# Altium footprint library OneBoxLib_OTHER.PcbLib: 64 footprints (part 1 of 4)
Each footprint in its own frame and in the unit in brackets; x right, y up, seen from the top. Pads: shape width x height; smd on the part's side, far side on the other; paste and mask are expansions set on the pad; w line width, h text height; cw(c..) or ccw(c..) is an arc to the next point about the centre after c.
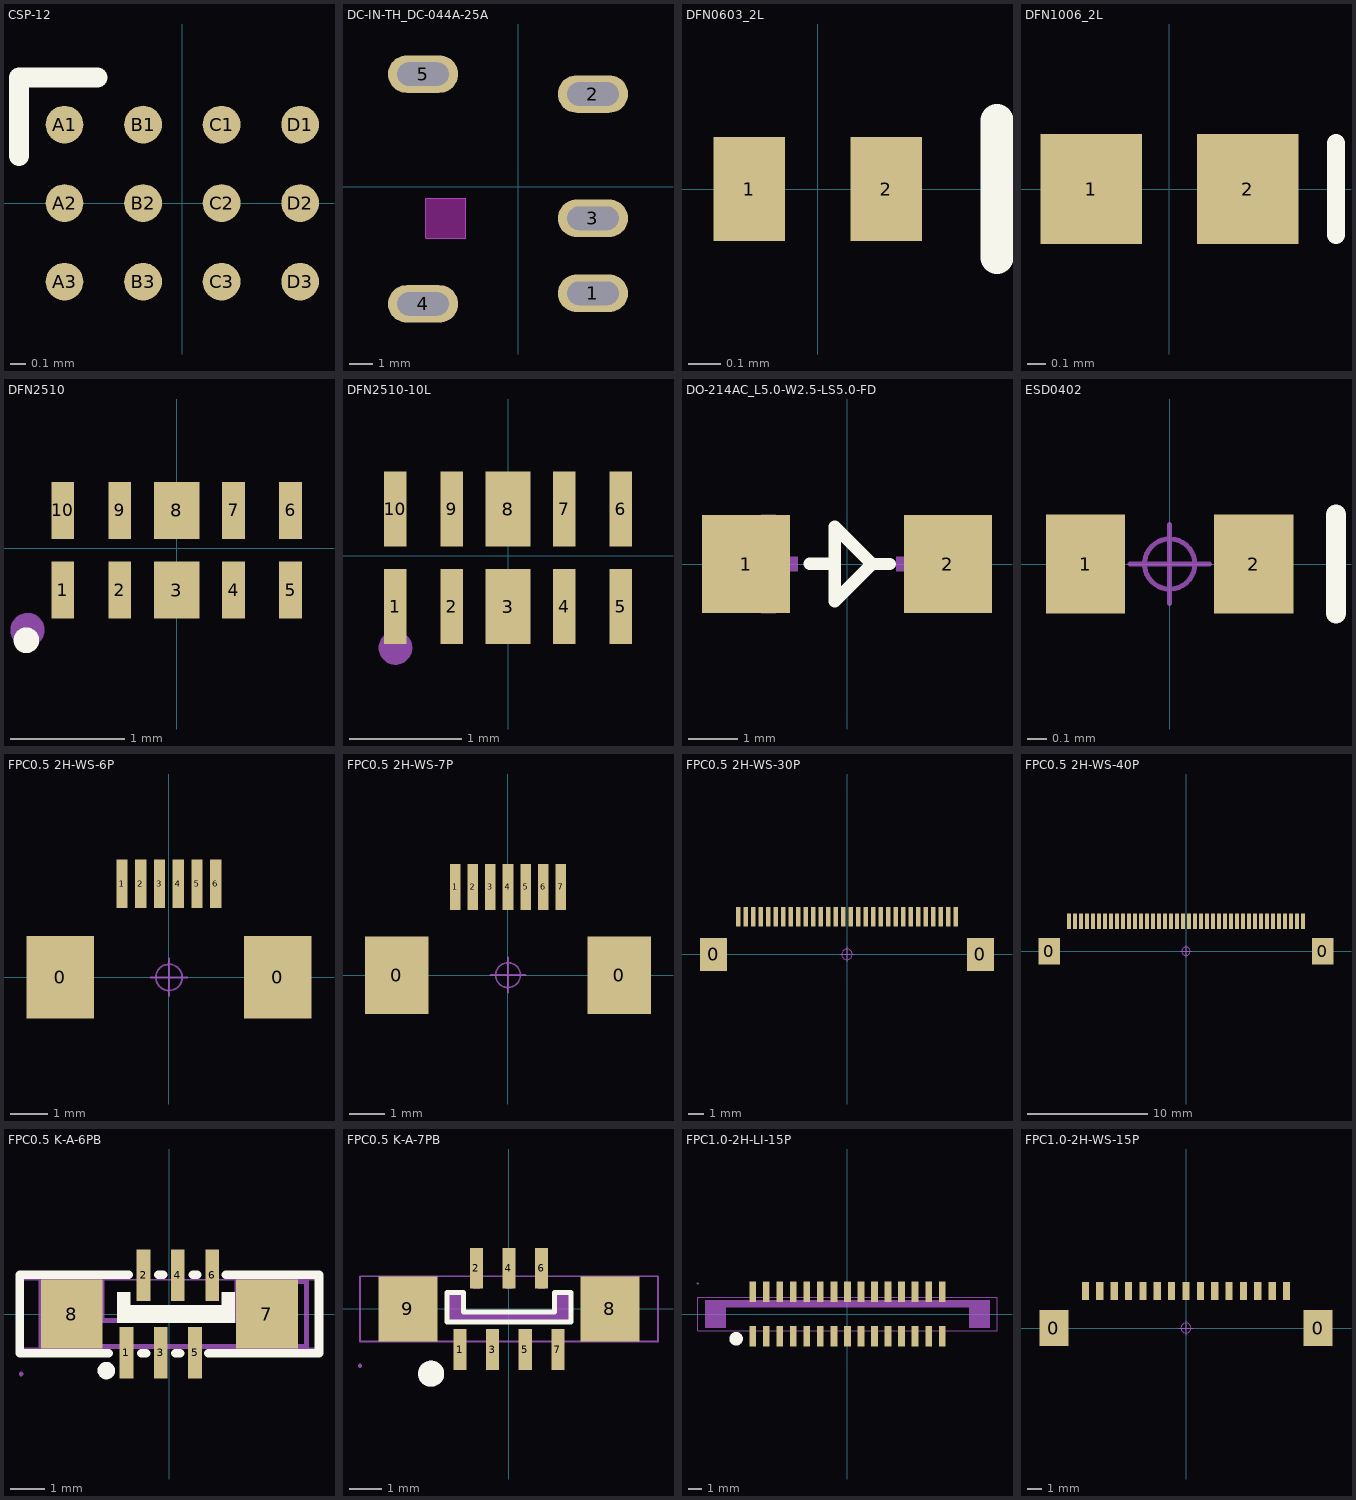
[diagram p0: the footprints below, top view; thin cyan lines are the x and y axes]

## CSP-12 [mm]
pads (12):
  round 0.24 smd: A1(-0.75,0.5) A2(-0.75,0) A3(-0.75,-0.5) B1(-0.25,0.5) B2(-0.25,0) B3(-0.25,-0.5) C1(0.25,0.5) C2(0.25,0) C3(0.25,-0.5) D1(0.75,0.5) D2(0.75,0) D3(0.75,-0.5)
Top Overlay:
  lines w0.125: -1.04,0.3 -1.04,0.8 -0.54,0.8
3D body "CSP-12.STEP": height 0.52, standoff -0.1, extent -0.95,-0.7 0.95,0.7

## DC-IN-TH_DC-044A-25A [mm]
pads (5):
  oval 3x1.6 hole 1 slot 2.2 at 0 deg: 1(3.188,-4.546) 2(3.188,3.954) 3(3.188,-1.346) 4(-4.062,-4.996) 5(-4.062,4.804)
Keep-Out Layer:
  board cut-out: -3.937,-2.196 -2.237,-2.196 -2.237,-0.496 -3.937,-0.496
Mechanical 1:
  lines w0.003: -3.937,-2.196 -3.937,-0.496 -2.237,-0.496 -2.237,-2.196 -3.937,-2.196
Mechanical 15:
  lines w0.003: 0.059,0.031 0.06,0.031
3D body "DC-044A.STEP": height 8.8, standoff -1.4, extent -7.15,-5.25 4.75,5.115

## DFN0603_2L [mm]
pads (2):
  rect 0.22x0.32 smd: 1(-0.21,0) 2(0.21,0)
Top Overlay:
  lines w0.1: 0.55,-0.21 0.55,0.21
3D body "DFN0603.STEP": height 0.28, standoff -0.01, extent -0.305,-0.16 0.305,0.16

## DFN1006_2L [mm]
pads (2):
  rect 0.55x0.6 smd: 1(-0.425,0) 2(0.425,0)
Top Overlay:
  lines w0.1: 0.905,-0.25 0.905,0.25
Mechanical 15:
  region: -0.575,0.05 -0.175,0.05 -0.175,-0.05 -0.575,-0.05
  region: 0.375,-0.2 0.375,0.2 0.475,0.2 0.475,-0.2
  region: 0.225,0.05 0.625,0.05 0.625,-0.05 0.225,-0.05
3D body "DFN1006-2L.STEP": height 0.45, standoff 0, extent -0.525,-0.3 0.475,0.3

## DFN2510 [mm]
pads (10):
  rect 0.2x0.5 smd: 1(-1,-0.37) 2(-0.5,-0.37) 4(0.5,-0.37) 5(1,-0.37) 6(1,0.33) 7(0.5,0.33) 9(-0.5,0.33) 10(-1,0.33)
  rect 0.4x0.5 smd: 3(0,-0.37) 8(0,0.33)
Top Overlay:
  circle w0.125: c-1.32,-0.81 r0.05
Top Paste:
  region: -1.101,0.58 -0.9,0.58 -0.9,0.083 -1.1,0.083 -1.1,0.084
  region: -0.601,0.58 -0.4,0.58 -0.4,0.083 -0.6,0.083 -0.6,0.084
  region: 0.399,0.58 0.6,0.58 0.6,0.083 0.4,0.083 0.4,0.084
  region: 0.899,0.58 1.1,0.58 1.1,0.083 0.9,0.083 0.9,0.084
  region: 0.899,-0.117 1.1,-0.117 1.1,-0.62 0.9,-0.62
  region: 0.399,-0.117 0.6,-0.117 0.6,-0.62 0.4,-0.62
  region: -1.101,-0.117 -0.9,-0.117 -0.9,-0.62 -1.1,-0.62
  region: -0.601,-0.117 -0.4,-0.117 -0.4,-0.62 -0.6,-0.62
  region: -0.2,-0.117 0.2,-0.117 0.2,-0.62 -0.2,-0.62
  region: -0.2,0.58 0.2,0.58 0.2,0.083 -0.2,0.083
Mechanical 15:
  circle w0.15: c-1.31,-0.72 r0.075
3D body "DFN2510.STEP": height 0.52, standoff 0, extent -1.25,-0.53 1.25,0.49

## DFN2510-10L [mm]
pads (10):
  rect 0.2x0.665 smd: 1(-1,-0.45) 2(-0.5,-0.45) 4(0.5,-0.45) 5(1,-0.45) 6(1,0.416) 7(0.5,0.416) 9(-0.5,0.416) 10(-1,0.416)
  rect 0.4x0.665 smd: 3(0,-0.45) 8(0,0.416)
Top Paste:
  region: -0.2,-0.117 0.2,-0.117 0.2,-0.783 -0.2,-0.783
  region: -0.2,0.748 0.2,0.748 0.2,0.083 -0.2,0.083
  region: -0.601,-0.117 -0.4,-0.117 -0.4,-0.782 -0.6,-0.782
  region: -1.101,-0.117 -0.9,-0.117 -0.9,-0.782 -1.1,-0.782
  region: 0.399,-0.117 0.6,-0.117 0.6,-0.782 0.4,-0.782
  region: 0.899,-0.117 1.1,-0.117 1.1,-0.782 0.9,-0.782
  region: 0.899,0.748 1.1,0.748 1.1,0.083 0.9,0.083 0.9,0.084
  region: 0.399,0.748 0.6,0.748 0.6,0.083 0.4,0.083 0.4,0.084
  region: -0.601,0.748 -0.4,0.748 -0.4,0.083 -0.6,0.083 -0.6,0.084
  region: -1.101,0.748 -0.9,0.748 -0.9,0.083 -1.1,0.083 -1.1,0.084
Mechanical 15:
  circle w0.15: c-1,-0.817 r0.075

## DO-214AC_L5.0-W2.5-LS5.0-FD [mm]
pads (2):
  rect 1.8x2 smd: 1(-2.06,0) 2(2.06,0)
Top Overlay:
  lines w0.254: -0.762,0.003 -0.508,0.003 -0.254,0.003 ; 0.869,0 0.508,0 ; 0.508,0 -0.254,-0.762 -0.254,0.762 0.508,0
Mechanical 15:
  region: -1.75,-1 -1.75,1 -1.45,1 -1.45,-1
  region: 2.2,-0.15 2.2,0.15 1,0.15 1,-0.15
  region: -2.2,-0.15 -2.2,0.15 -1,0.15 -1,-0.15
3D body "DO-214AC.STEP": height -0.1, standoff -2.25, extent -2.499,-1.2 2.499,1.299

## ESD0402 [mm]
pads (2):
  rect 0.4x0.5 smd: 1(-0.425,0) 2(0.425,0)
Top Overlay:
  lines w0.1: 0.84,-0.25 0.84,0.25
Mechanical 15:
  circle w0.025: c0,0 r0.127
  lines w0.025: -0.2,0 0.2,0 ; 0,-0.2 0,0.2
3D body "ESD0402.STEP": height 0.5, standoff 0, extent -0.48,-0.25 0.52,0.25

## FPC0.5 2H-WS-6P [mm] "长：7.2mm，宽：5.2mm，高：2mm"
pads (8):
  rect 1.8x2.2 smd: 0(-2.9,0) 0(2.9,0)
  rect 0.3x1.3 smd: 1(-1.25,2.497) 2(-0.75,2.497) 3(-0.25,2.497) 4(0.25,2.497) 5(0.75,2.497) 6(1.25,2.497)
Mechanical 15:
  circle w0.05: c0,0 r0.35
  lines w0.05: -0.5,0 0.5,0 ; 0,-0.5 0,0.5
3D body "FPC0.5 2H-S-W-6P.STEP": height 2, standoff -0.01, extent -3.6,-3.15 3.6,2.85

## FPC0.5 2H-WS-7P [mm] "长：7.7mm，宽：5.2mm，高：2mm"
pads (9):
  rect 1.8x2.2 smd: 0(-3.15,0) 0(3.15,0)
  rect 0.3x1.3 smd: 1(-1.5,2.497) 2(-1,2.497) 3(-0.5,2.497) 4(0,2.497) 5(0.5,2.497) 6(1,2.497) 7(1.5,2.497)
Mechanical 15:
  circle w0.05: c0,0 r0.35
  lines w0.05: -0.5,0 0.5,0 ; 0,-0.5 0,0.5
3D body "FPC0.5 2H-S-W-7P.STEP": height 2, standoff -0.01, extent -3.85,-3.15 3.85,2.85

## FPC0.5 2H-WS-30P [mm] "长：19.2mm，宽：5.2mm，高：2mm"
pads (32):
  rect 1.8x2.2 smd: 0(-8.9,0) 0(8.9,0)
  rect 0.3x1.3 smd: 1(-7.25,2.497) 2(-6.75,2.497) 3(-6.25,2.497) 4(-5.75,2.497) 5(-5.25,2.497) 6(-4.75,2.497) 7(-4.25,2.497) 8(-3.75,2.497) 9(-3.25,2.497) 10(-2.75,2.497) 11(-2.25,2.497) 12(-1.75,2.497) 13(-1.25,2.497) 14(-0.75,2.497) 15(-0.25,2.497) 16(0.25,2.497) 17(0.75,2.497) 18(1.25,2.497) 19(1.75,2.497) 20(2.25,2.497) 21(2.75,2.497) 22(3.25,2.497) 23(3.75,2.497) 24(4.25,2.497) 25(4.75,2.497) 26(5.25,2.497) 27(5.75,2.497) 28(6.25,2.497) 29(6.75,2.497) 30(7.25,2.497)
Mechanical 15:
  circle w0.05: c0,0 r0.35
  lines w0.05: -0.5,0 0.5,0 ; 0,-0.5 0,0.5
3D body "FPC0.5 2H-S-W-30P.STEP": height 2, standoff -0.01, extent -9.6,-3.15 9.6,2.85

## FPC0.5 2H-WS-40P [mm] "长：24.2mm，宽：5.2mm，高：2mm"
pads (42):
  rect 1.8x2.2 smd: 0(-11.4,0) 0(11.4,0)
  rect 0.3x1.3 smd: 1(-9.75,2.497) 2(-9.25,2.497) 3(-8.75,2.497) 4(-8.25,2.497) 5(-7.75,2.497) 6(-7.25,2.497) 7(-6.75,2.497) 8(-6.25,2.497) 9(-5.75,2.497) 10(-5.25,2.497) 11(-4.75,2.497) 12(-4.25,2.497) 13(-3.75,2.497) 14(-3.25,2.497) 15(-2.75,2.497) 16(-2.25,2.497) 17(-1.75,2.497) 18(-1.25,2.497) 19(-0.75,2.497) 20(-0.25,2.497) 21(0.25,2.497) 22(0.75,2.497) 23(1.25,2.497) 24(1.75,2.497) 25(2.25,2.497) 26(2.75,2.497) 27(3.25,2.497) 28(3.75,2.497) 29(4.25,2.497) 30(4.75,2.497) 31(5.25,2.497) 32(5.75,2.497) 33(6.25,2.497) 34(6.75,2.497) 35(7.25,2.497) 36(7.75,2.497) 37(8.25,2.497) 38(8.75,2.497) 39(9.25,2.497) 40(9.75,2.497)
Mechanical 15:
  circle w0.05: c0,0 r0.35
  lines w0.05: -0.5,0 0.5,0 ; 0,-0.5 0,0.5
3D body "FPC0.5 2H-S-W-40P.STEP": height 2, standoff -0.01, extent -12.1,-3.15 12.1,2.85

## FPC0.5 K-A-6PB [mm] "长：7.2mm，宽：5.2mm，高：2mm"
pads (8):
  rect 0.4x1.5 smd mask+0.05: 1(-1.25,-1.125) 2(-0.75,1.125) 3(-0.25,-1.125) 4(0.25,1.125) 5(0.75,-1.125) 6(1.25,1.125)
  rect 1.8x2 smd mask+0.05: 7(2.85,0) 8(-2.85,0)
Top Overlay:
  circle w0.254: c-1.838,-1.651 r0.127
  region: -1.524,-0.254 -1.524,0.635 -1.143,0.635 -1.143,0.254 1.524,0.254 1.524,0.635 1.905,0.635 1.905,-0.254 -1.524,-0.254
  lines w0.254: -1.769,-1.143 -4.367,-1.143 -4.367,1.143 -1.181,1.143 ; -0.819,-1.143 -0.681,-1.143 ; -0.319,1.143 -0.181,1.143 ; 0.181,-1.143 0.319,-1.143 ; 0.681,1.143 0.819,1.143 ; 1.143,-1.143 4.367,-1.143 4.367,1.143 1.651,1.143
Mechanical 6:
  region: -3.81,1.016 -3.683,1.016 -3.683,-1.016 -3.81,-1.016
  region: -3.81,1.016 -1.905,1.016 -1.905,-0.127 1.905,-0.127 1.905,1.016 4.064,1.016 4.064,-1.016 -3.81,-1.016 -3.81,-0.889 3.937,-0.889 3.937,0.889 2.032,0.889 2.032,-0.254 -2.032,-0.254 -2.032,0.889 -3.81,0.889
Mechanical 15:
  region: -3.65,0.9 -2.05,0.9 -2.05,-0.9 -3.65,-0.9
  region: 3.65,-0.9 2.05,-0.9 2.05,0.9 3.65,0.9
  region: -1.15,-1.75 -1.35,-1.75 -1.35,-0.85 -1.15,-0.85
  region: -0.65,0.85 -0.85,0.85 -0.85,1.75 -0.65,1.75
  region: -0.15,-1.75 -0.35,-1.75 -0.35,-0.85 -0.15,-0.85
  region: 0.35,0.85 0.15,0.85 0.15,1.75 0.35,1.75
  region: 0.85,-1.75 0.65,-1.75 0.65,-0.85 0.85,-0.85
  region: 1.35,0.85 1.15,0.85 1.15,1.75 1.35,1.75
  region: -4.265,-1.75 -4.265,-1.725 -4.3,-1.69 -4.35,-1.69 -4.385,-1.725 -4.385,-1.75 -4.385,-1.775 -4.35,-1.81 -4.3,-1.81 -4.265,-1.775
  lines w0.051: -4.325,-1 4.325,-1 4.325,1 -4.325,1 -4.325,-1
3D body "0.5K-A-6PB.STEP": height 4.45, standoff 0.05, extent -4.3,-1.75 4.3,1.75

## FPC0.5 K-A-7PB [mm] "长：7.7mm，宽：5.2mm，高：2mm"
pads (9):
  rect 0.4x1.25 smd mask+0.05: 1(-1.5,-1.25) 2(-1,1.25) 3(-0.5,-1.25) 4(0,1.25) 5(0.5,-1.25) 6(1,1.25) 7(1.5,-1.25)
  rect 1.8x2 smd mask+0.05: 8(3.1,0) 9(-3.1,0)
Top Overlay:
  circle w0.4: c-2.39,-1.99 r0.2
  lines w0.152: -1.901,-0.401 -1.901,0.501 -1.401,0.501 -1.401,-0.101 1.401,-0.101 1.401,0.501 1.901,0.501 1.901,-0.401 -1.901,-0.401
Mechanical 6:
  circle w0.4: c-2.39,-1.99 r0.2
  region: -1.401,0.501 -1.901,0.501 -1.901,-0.401 1.901,-0.401 1.901,0.501 1.4,0.5 1.401,-0.101 -1.401,-0.101
Mechanical 15:
  region: -4.515,-1.75 -4.515,-1.725 -4.55,-1.69 -4.6,-1.69 -4.635,-1.725 -4.635,-1.75 -4.635,-1.775 -4.6,-1.81 -4.55,-1.81 -4.515,-1.775
  region: 1.4,-0.75 1.6,-0.75 1.6,-1.75 1.4,-1.75
  region: 0.9,1.625 1.1,1.625 1.1,0.625 0.9,0.625
  region: 0.4,-0.75 0.6,-0.75 0.6,-1.75 0.4,-1.75
  region: -0.1,1.625 0.1,1.625 0.1,0.625 -0.1,0.625
  region: -0.6,-0.75 -0.4,-0.75 -0.4,-1.75 -0.6,-1.75
  region: -1.1,1.625 -0.9,1.625 -0.9,0.625 -1.1,0.625
  region: -1.6,-0.75 -1.4,-0.75 -1.4,-1.75 -1.6,-1.75
  region: -3.82,-0.8 -2.38,-0.8 -2.38,0.8 -3.82,0.8
  region: 2.38,-0.8 3.82,-0.8 3.82,0.8 2.38,0.8
  lines w0.051: -4.575,-1 -4.575,1 4.575,1 4.575,-1 -4.575,-1
3D body "0.5K-A-7PB.STEP": height 4.55, standoff 0.05, extent -4.595,-1.73 4.555,1.77

## FPC1.0-2H-LI-15P [mm] "翻盖FPC，脚距1mm，不含脚（长19.9mm，宽5.2mm，高1.96mm）"
pads (30):
  rect 0.5x1.5 smd mask+0.05: 1(-7,-1.65) 1(-7,1.65) 2(-6,-1.65) 2(-6,1.65) 3(-5,-1.65) 3(-5,1.65) 4(-4,-1.65) 4(-4,1.65) 5(-3,-1.65) 5(-3,1.65) 6(-2,-1.65) 6(-2,1.65) 7(-1,-1.65) 7(-1,1.65) 8(0,-1.65) 8(0,1.65) 9(1,-1.65) 9(1,1.65) 10(2,-1.65) 10(2,1.65) 11(3,-1.65) 11(3,1.65) 12(4,-1.65) 12(4,1.65) 13(5,-1.65) 13(5,1.65) 14(6,-1.65) 14(6,1.65) 15(7,-1.65) 15(7,1.65)
Top Overlay:
  circle w0.5: c-8.22,-1.83 r0.25
Mechanical 6:
  region: -9.5,-1 -10.5,-1 -10.5,1 10.5,1 10.5,-1 9,-1 9,0.5 -9,0.5 -9,-1
Mechanical 15:
  drawing of 35 lines, arcs and shapes, not listed
3D body "FPC1.0-15P-LI.STEP": height 5.5, standoff 0.1, extent -11.05,-2.25 11.05,2.25

## FPC1.0-2H-WS-15P [mm] "翻盖FPC，脚距1mm，不含脚（长19.9mm，宽5.2mm，高1.96mm）"
pads (17):
  rect 2x2.5 smd: 0(-9.19,0) 0(9.19,0)
  rect 0.5x1.25 smd: 1(-7,2.575) 2(-6,2.575) 3(-5,2.575) 4(-4,2.575) 5(-3,2.575) 6(-2,2.575) 7(-1,2.575) 8(0,2.575) 9(1,2.575) 10(2,2.575) 11(3,2.575) 12(4,2.575) 13(5,2.575) 14(6,2.575) 15(7,2.575)
Mechanical 15:
  circle w0.05: c0,0 r0.35
  lines w0.05: -0.5,0 0.5,0 ; 0,-0.5 0,0.5
3D body "FPC1.0 2H-WS-15P.STEP": height 2, standoff -0.02, extent -9.95,-3.15 9.95,2.85